# Altium footprint library PCB_GENERAL.PcbLib: 226 footprints (part 9 of 15)
Each footprint in its own frame and in the unit in brackets; x right, y up, seen from the top. Pads: shape width x height; smd on the part's side, far side on the other; paste and mask are expansions set on the pad; w line width, h text height; cw(c..) or ccw(c..) is an arc to the next point about the centre after c.
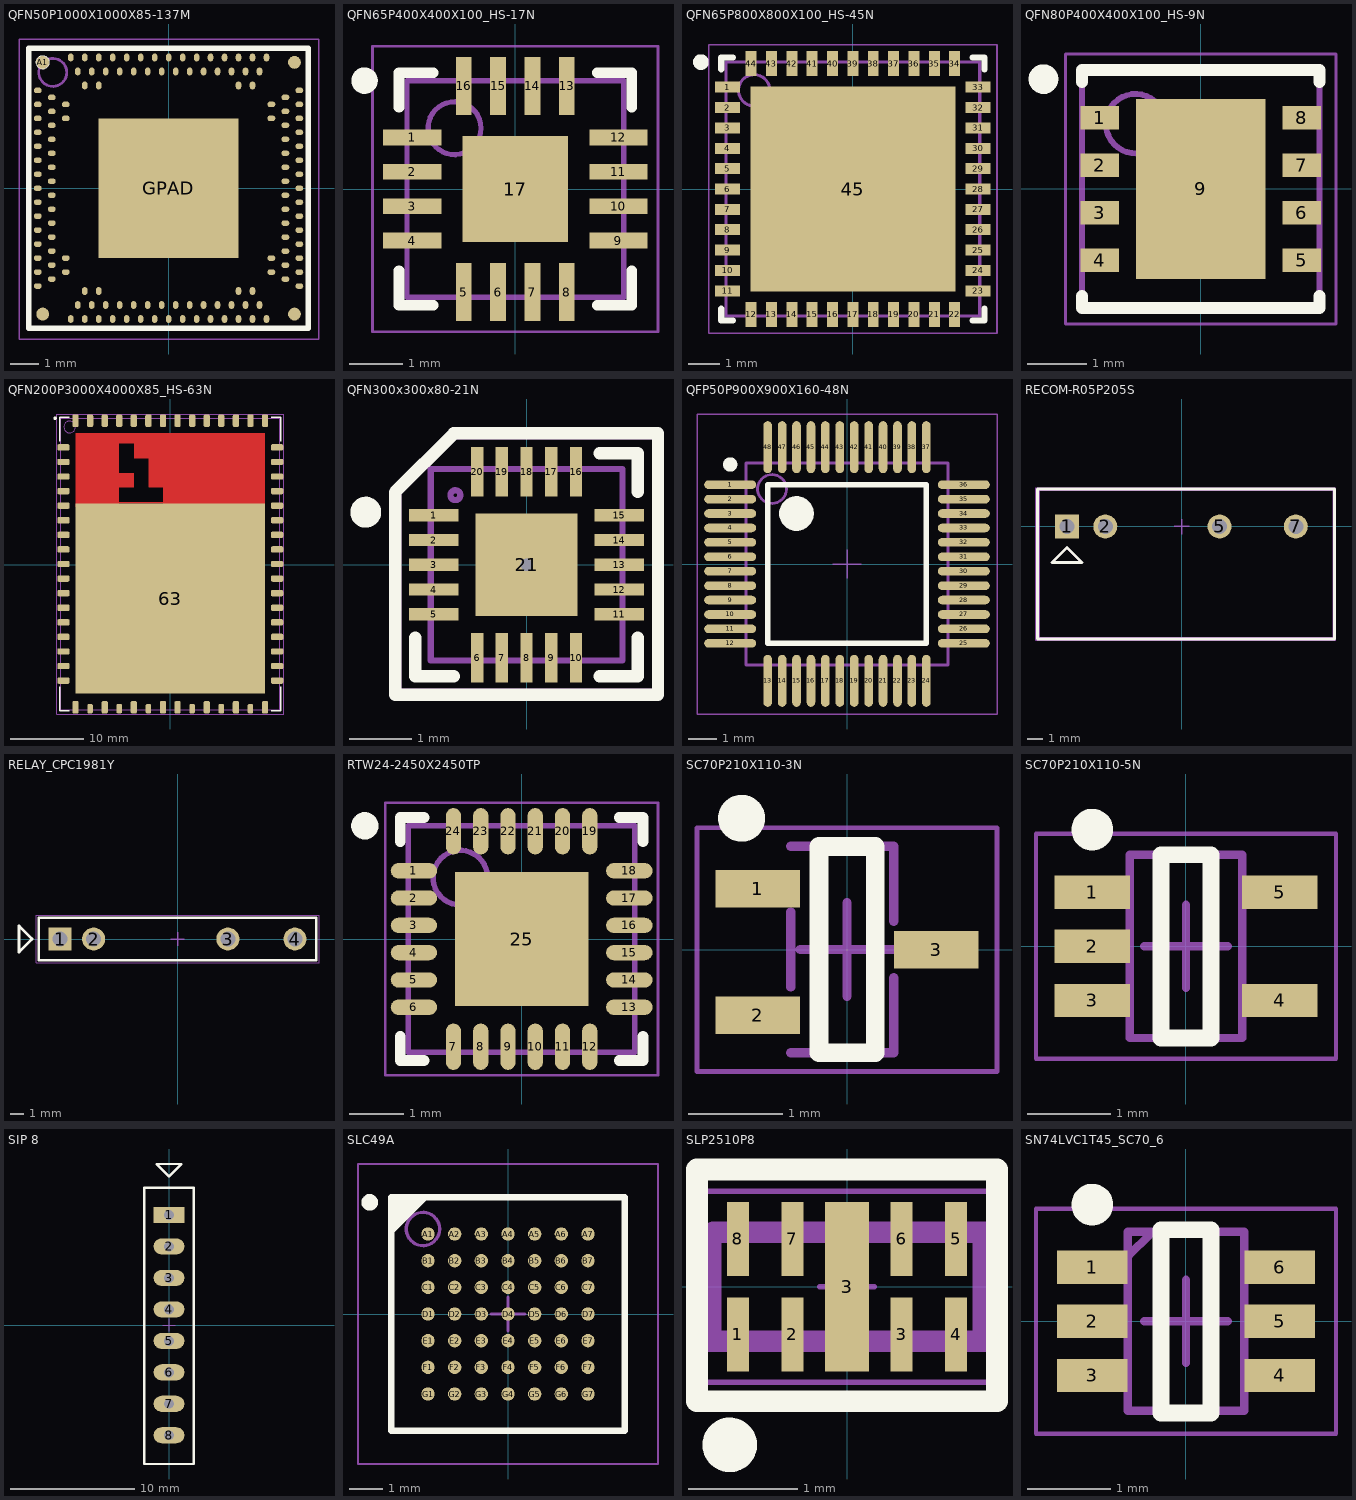
[diagram p8: the footprints below, top view; thin cyan lines are the x and y axes]

## QFN50P1000X1000X85-137M [mm] "Double Row QFN, 137-Leads, Body 10.0x10.0mm (max), Pitch 0.50mm, IPC Low Density"
height 0.85
pads (137):
  round 0.46 smd: A1(-4.5,4.5) A17(-4.5,-4.5) A33(4.5,-4.5) A49(4.5,4.5)
  oval 0.28x0.2 smd: A2(-4.675,3.5) A3(-4.675,3) A4(-4.675,2.5) A5(-4.675,2) A6(-4.675,1.5) A7(-4.675,1) A8(-4.675,0.5) A9(-4.675,0) A10(-4.675,-0.5) A11(-4.675,-1) A12(-4.675,-1.5) A13(-4.675,-2) A14(-4.675,-2.5) A15(-4.675,-3) A16(-4.675,-3.5) A34(4.675,-3.5) A35(4.675,-3) A36(4.675,-2.5) A37(4.675,-2) A38(4.675,-1.5) A39(4.675,-1) A40(4.675,-0.5) A41(4.675,0) A42(4.675,0.5) A43(4.675,1) A44(4.675,1.5) A45(4.675,2) A46(4.675,2.5) A47(4.675,3) A48(4.675,3.5) B1(-4.175,3.25) B2(-4.175,2.75) B3(-4.175,2.25) B4(-4.175,1.75) B5(-4.175,1.25) B6(-4.175,0.75) B7(-4.175,0.25) B8(-4.175,-0.25) B9(-4.175,-0.75) B10(-4.175,-1.25) B11(-4.175,-1.75) B12(-4.175,-2.25) B13(-4.175,-2.75) B14(-4.175,-3.25) B29(4.175,-3.25) B30(4.175,-2.75) B31(4.175,-2.25) B32(4.175,-1.75) B33(4.175,-1.25) B34(4.175,-0.75) B35(4.175,-0.25) B36(4.175,0.25) B37(4.175,0.75) B38(4.175,1.25) B39(4.175,1.75) B40(4.175,2.25) B41(4.175,2.75) B42(4.175,3.25) C1(-3.675,3) C2(-3.675,2.5) C3(-3.675,-2.5) C4(-3.675,-3) C9(3.675,-3) C10(3.675,-2.5) C11(3.675,2.5) C12(3.675,3)
  oval 0.2x0.28 smd: A18(-3.5,-4.675) A19(-3,-4.675) A20(-2.5,-4.675) A21(-2,-4.675) A22(-1.5,-4.675) A23(-1,-4.675) A24(-0.5,-4.675) A25(0,-4.675) A26(0.5,-4.675) A27(1,-4.675) A28(1.5,-4.675) A29(2,-4.675) A30(2.5,-4.675) A31(3,-4.675) A32(3.5,-4.675) A50(3.5,4.675) A51(3,4.675) A52(2.5,4.675) A53(2,4.675) A54(1.5,4.675) A55(1,4.675) A56(0.5,4.675) A57(0,4.675) A58(-0.5,4.675) A59(-1,4.675) A60(-1.5,4.675) A61(-2,4.675) A62(-2.5,4.675) A63(-3,4.675) A64(-3.5,4.675) B15(-3.25,-4.175) B16(-2.75,-4.175) B17(-2.25,-4.175) B18(-1.75,-4.175) B19(-1.25,-4.175) B20(-0.75,-4.175) B21(-0.25,-4.175) B22(0.25,-4.175) B23(0.75,-4.175) B24(1.25,-4.175) B25(1.75,-4.175) B26(2.25,-4.175) B27(2.75,-4.175) B28(3.25,-4.175) B43(3.25,4.175) B44(2.75,4.175) B45(2.25,4.175) B46(1.75,4.175) B47(1.25,4.175) B48(0.75,4.175) B49(0.25,4.175) B50(-0.25,4.175) B51(-0.75,4.175) B52(-1.25,4.175) B53(-1.75,4.175) B54(-2.25,4.175) B55(-2.75,4.175) B56(-3.25,4.175) C5(-3,-3.675) C6(-2.5,-3.675) C7(2.5,-3.675) C8(3,-3.675) C13(3,3.675) C14(2.5,3.675) C15(-2.5,3.675) C16(-3,3.675)
  rect 5x5 smd paste-5: GPAD(0,0)
Top Overlay:
  circle w0.25: c-4.5,4.5 r0.125
  lines w0.2: -5,-5 -5,5 5,5 5,-5 -5,-5
Top Paste:
  region: 1.425,1.425 0.16,1.425 0.16,0.16 1.425,0.16
  region: 1.425,-1.425 1.425,-0.16 0.16,-0.16 0.16,-1.425
  region: -1.425,-1.425 -0.16,-1.425 -0.16,-0.16 -1.425,-0.16
  region: -1.425,1.425 -1.425,0.16 -0.16,0.16 -0.16,1.425
Mechanical 11:
  text ".Designator" at -2.6,1.05 h1
Mechanical 14:
  circle w0.1: c-4.14,4.14 r0.5
  lines w0.1: -5,-5 -5,5 5,5 5,-5 -5,-5
Mechanical 15:
  lines w0.05: -5.335,-5.39 5.365,-5.39 5.365,5.335 -5.335,5.335 -5.335,-5.39
  lines w0.1: -0.5,0 0.5,0 ; 0,-0.5 0,0.5
3D body: height 0.85, standoff 0.12, extent -5,-5 5,5

## QFN65P400X400X100_HS-17N [mm] "QFN, 16-Leads, Body 4,00x4,00mm, Pitch 0,65mm, Thermal Pad 2,10x2,10mm, IPC Medium Density"
height 1
pads (17):
  rect 1.1x0.3 smd: 1(-1.95,0.975) 2(-1.95,0.325) 3(-1.95,-0.325) 4(-1.95,-0.975) 9(1.95,-0.975) 10(1.95,-0.325) 11(1.95,0.325) 12(1.95,0.975)
  rect 0.3x1.1 smd: 5(-0.975,-1.95) 6(-0.325,-1.95) 7(0.325,-1.95) 8(0.975,-1.95) 13(0.975,1.95) 14(0.325,1.95) 15(-0.325,1.95) 16(-0.975,1.95)
  rect 2x2 smd: 17(0,0)
Top Overlay:
  circle w0.25: c-2.85,2.05 r0.125
  lines w0.2: -2.2,-1.55 -2.2,-2.2 -1.55,-2.2 ; -2.2,1.55 -2.2,2.2 -1.55,2.2 ; 1.55,-2.2 2.2,-2.2 2.2,-1.55 ; 1.55,2.2 2.2,2.2 2.2,1.55
Mechanical 11:
  text ".Designator" at -1.9,-0.3 h1
Mechanical 14:
  circle w0.1: c-1.15,1.15 r0.5
  lines w0.1: -2.05,-2.05 -2.05,2.05 2.05,2.05 2.05,-2.05 -2.05,-2.05
Mechanical 15:
  lines w0.05: -2.7,-2.7 -2.7,2.7 2.7,2.7 2.7,-2.7 -2.7,-2.7
  lines w0.1: -0.5,0 0.5,0 ; 0,-0.5 0,0.5
3D body "QFN65P400X400X100_HS-17N.step": height 1, standoff 0, extent -2.051,-2.051 2.051,2.051

## QFN65P800X800X100_HS-45N [mm] "QFN, 44-Leads, Body 8,00x8,00mm, Pitch 0,65mm, Thermal Pad 6,55x6,55mm, IPC Medium Density"
height 1
pads (45):
  rect 0.8x0.35 smd: 1(-4,3.25) 2(-4,2.6) 3(-4,1.95) 4(-4,1.3) 5(-4,0.65) 6(-4,0) 7(-4,-0.65) 8(-4,-1.3) 9(-4,-1.95) 10(-4,-2.6) 11(-4,-3.25) 23(4,-3.25) 24(4,-2.6) 25(4,-1.95) 26(4,-1.3) 27(4,-0.65) 28(4,0) 29(4,0.65) 30(4,1.3) 31(4,1.95) 32(4,2.6) 33(4,3.25)
  rect 0.35x0.8 smd: 12(-3.25,-4) 13(-2.6,-4) 14(-1.95,-4) 15(-1.3,-4) 16(-0.65,-4) 17(0,-4) 18(0.65,-4) 19(1.3,-4) 20(1.95,-4) 21(2.6,-4) 22(3.25,-4) 34(3.25,4) 35(2.6,4) 36(1.95,4) 37(1.3,4) 38(0.65,4) 39(0,4) 40(-0.65,4) 41(-1.3,4) 42(-1.95,4) 43(-2.6,4) 44(-3.25,4)
  rect 6.55x6.55 smd: 45(0,0)
Top Overlay:
  circle w0.25: c-4.85,4.05 r0.125
  lines w0.2: -4.2,-3.825 -4.2,-4.2 -3.825,-4.2 ; -4.2,3.825 -4.2,4.2 -3.825,4.2 ; 3.825,-4.2 4.2,-4.2 4.2,-3.825 ; 3.825,4.2 4.2,4.2 4.2,3.825
Mechanical 11:
  text ".Designator" at -2.2,-0.3 h1
Mechanical 14:
  circle w0.1: c-3.15,3.15 r0.5
  lines w0.1: -4.05,-4.05 4.05,-4.05 4.05,4.05 -4.05,4.05 -4.05,-4.05
Mechanical 15:
  lines w0.05: -4.6,-4.6 4.6,-4.6 4.6,4.6 -4.6,4.6 -4.6,-4.6
  lines w0.1: -0.5,0 0.5,0 ; 0,-0.5 0,0.5
3D body: height 1, standoff 0.05, extent -4.05,-4.05 4.05,4.05

## QFN80P400X400X100_HS-9N [mm] "PQFN, 8-Leads, Body 4,00x4,00mm, Pitch 0,80mm, Thermal Pad 2,18x3,03mm, IPC Medium Density"
height 1
pads (17):
  rect 0.65x0.4 smd: 1(-1.7,1.2) 2(-1.7,0.4) 3(-1.7,-0.4) 4(-1.7,-1.2) 5(1.7,-1.2) 6(1.7,-0.4) 7(1.7,0.4) 8(1.7,1.2)
  rect 0x0 smd: 9(-0.85,0) 10(-0.35,0) 11(0,0.85) 12(0,0.35) 13(0.85,0) 14(0.35,0) 15(0,-0.85) 16(0,-0.35)
  rect 2.18x3.03 smd: 9(0,0)
Top Overlay:
  circle w0.25: c-2.65,1.85 r0.125
  lines w0.2: -2,-1.8 -2,-2 2,-2 2,-1.8 ; -2,1.8 -2,2 2,2 2,1.8
Mechanical 11:
  text ".Designator" at -2.325,2.675 h1
Mechanical 14:
  circle w0.1: c-1.1,1.1 r0.5
  lines w0.1: -2,-2 -2,2 2,2 2,-2 -2,-2
Mechanical 15:
  lines w0.05: -0.5,0 0.5,0 ; 0,-0.5 0,0.5 ; -2.275,-2.275 -2.275,2.275 2.275,2.275 2.275,-2.275 -2.275,-2.275
3D body: height 1, standoff 0.05, extent -2,-2 2,2

## QFN200P3000X4000X85_HS-63N [mm] "QFN, 62-Leads, Body 30,00x40,00mm, Pitch 2,00mm, Thermal Pad 28,30x38,30mm, IPC Medium Density"
height 0.85
pads (63):
  rrect50% 1.7x0.87 smd: 1(-14.65,16.1) 2(-14.65,14.1) 3(-14.65,12.1) 4(-14.65,10.1) 5(-14.65,8.1) 6(-14.65,6.1) 7(-14.65,4.1) 8(-14.65,2.1) 9(-14.65,0.1) 10(-14.65,-1.9) 11(-14.65,-3.9) 12(-14.65,-5.9) 13(-14.65,-7.9) 14(-14.65,-9.9) 15(-14.65,-11.9) 16(-14.65,-13.9) 17(-14.65,-15.9) 32(14.65,-15.9) 33(14.65,-13.9) 34(14.65,-11.9) 35(14.65,-9.9) 36(14.65,-7.9) 37(14.65,-5.9) 38(14.65,-3.9) 39(14.65,-1.9) 40(14.65,0.1) 41(14.65,2.1) 42(14.65,4.1) 43(14.65,6.1) 44(14.65,8.1) 45(14.65,10.1) 46(14.65,12.1) 47(14.65,14.1) 48(14.65,16.1)
  rrect50% 0.87x1.7 smd: 18(-13,-19.55) 20(-9,-19.55) 22(-5,-19.55) 24(-1,-19.55) 25(1,-19.55) 27(5,-19.55) 29(9,-19.55) 31(13,-19.55) 49(13,19.75) 50(11,19.75) 51(9,19.75) 52(7,19.75) 53(5,19.75) 54(3,19.75) 55(1,19.75) 56(-1,19.75) 57(-3,19.75) 58(-5,19.75) 59(-7,19.75) 60(-9,19.75) 61(-11,19.75) 62(-13,19.75)
  rrect50% 0.76x1.28 smd: 19(-11,-19.75) 21(-7,-19.75) 23(-3,-19.75) 26(3,-19.75) 28(7,-19.75) 30(11,-19.75)
  rect 26x26.1 smd paste-100: 63(0,-4.645)
Top Layer:
  rectangle: -7,8.4 -1,8.6
  rectangle: -7.1,16.6 -1,18.1
  rectangle: -8,10.6 -5,12.6
  rectangle: -13,8 -7,18.1
  rectangle: -1,7.8 13,18.1
  rectangle: -5,14.6 -2.8,16.8
  rectangle: -3,10.6 -0.6,16.8
Top Overlay:
  circle w0.25: c-15.8,20.1 r0.125
  lines w0.2: -15.15,-16.75 -15.15,-20.05 -13.85,-20.05 ; -15.15,16.95 -15.15,20.25 -13.85,20.25 ; 13.85,-20.05 15.15,-20.05 15.15,-16.75 ; 13.85,20.25 15.15,20.25 15.15,16.95
Top Paste:
  rectangle: -2.5,11.1 -1.5,11.8
  rectangle: -6.5,17.1 -4.5,17.6
  rectangle: -3.5,15.8 -1.5,17.8
  rectangle: -2.5,12.8 -1.5,14.8
  rectangle: -6.5,11.1 -5.5,12.1
  region: 12.5,17.6 10.5,17.6 10.5,15.8 12.5,15.8
  region: 9.5,17.6 7.5,17.6 7.5,15.8 9.5,15.8
  region: 6.5,17.6 4.5,17.6 4.5,15.8 6.5,15.8
  region: 3.5,17.6 1.5,17.6 1.5,15.8 3.5,15.8
  rectangle: -0.5,15.8 0.5,17.6
  region: 12.5,14.8 10.5,14.8 10.5,12.8 12.5,12.8
  region: 9.5,14.8 7.5,14.8 7.5,12.8 9.5,12.8
  region: 6.5,14.8 4.5,14.8 4.5,12.8 6.5,12.8
  region: 3.5,14.8 1.5,14.8 1.5,12.8 3.5,12.8
  rectangle: -0.5,12.8 0.5,14.8
  region: 12.5,11.8 10.5,11.8 10.5,9.8 12.5,9.8
  region: 9.5,11.8 7.5,11.8 7.5,9.8 9.5,9.8
  region: 6.5,11.8 4.5,11.8 4.5,9.8 6.5,9.8
  region: 3.5,11.8 1.5,11.8 1.5,9.8 3.5,9.8
  rectangle: -0.5,9.8 0.5,11.8
  rectangle: -12.5,15.8 -10.5,17.6
  rectangle: -9.5,15.8 -7.5,17.6
  rectangle: -12.5,12.8 -10.5,14.8
  rectangle: -9.5,12.8 -7.5,14.8
  rectangle: -12.5,9.8 -10.5,11.8
  rectangle: -9.5,9.8 -7.5,11.8
  rectangle: -0.5,6.8 0.5,8.8
  region: 3.5,8.8 1.5,8.8 1.5,6.8 3.5,6.8
  region: 6.5,8.8 4.5,8.8 4.5,6.8 6.5,6.8
  region: 9.5,8.8 7.5,8.8 7.5,6.8 9.5,6.8
  region: 12.5,8.8 10.5,8.8 10.5,6.8 12.5,6.8
  rectangle: -3.5,6.8 -1.5,8.1
  rectangle: -6.5,6.8 -4.5,8.1
  rectangle: -9.5,6.8 -7.5,8.8
  rectangle: -12.5,6.8 -10.5,8.8
  rectangle: -0.5,3.8 0.5,5.8
  region: 3.5,5.8 1.5,5.8 1.5,3.8 3.5,3.8
  region: 6.5,5.8 4.5,5.8 4.5,3.8 6.5,3.8
  region: 9.5,5.8 7.5,5.8 7.5,3.8 9.5,3.8
  region: 12.5,5.8 10.5,5.8 10.5,3.8 12.5,3.8
  rectangle: -3.5,3.8 -1.5,5.8
  rectangle: -6.5,3.8 -4.5,5.8
  rectangle: -9.5,3.8 -7.5,5.8
  rectangle: -12.5,3.8 -10.5,5.8
  rectangle: -0.5,0.8 0.5,2.8
  region: 3.5,2.8 1.5,2.8 1.5,0.8 3.5,0.8
  region: 6.5,2.8 4.5,2.8 4.5,0.8 6.5,0.8
  region: 9.5,2.8 7.5,2.8 7.5,0.8 9.5,0.8
  region: 12.5,2.8 10.5,2.8 10.5,0.8 12.5,0.8
  rectangle: -3.5,0.8 -1.5,2.8
  rectangle: -6.5,0.8 -4.5,2.8
  rectangle: -9.5,0.8 -7.5,2.8
  rectangle: -12.5,0.8 -10.5,2.8
  rectangle: -0.5,-2.2 0.5,-0.2
  region: 3.5,-0.2 1.5,-0.2 1.5,-2.2 3.5,-2.2
  region: 6.5,-0.2 4.5,-0.2 4.5,-2.2 6.5,-2.2
  region: 9.5,-0.2 7.5,-0.2 7.5,-2.2 9.5,-2.2
  region: 12.5,-0.2 10.5,-0.2 10.5,-2.2 12.5,-2.2
  rectangle: -3.5,-2.2 -1.5,-0.2
  rectangle: -6.5,-2.2 -4.5,-0.2
  rectangle: -9.5,-2.2 -7.5,-0.2
  rectangle: -12.5,-2.2 -10.5,-0.2
  rectangle: -0.5,-5.2 0.5,-3.2
  region: 3.5,-3.2 1.5,-3.2 1.5,-5.2 3.5,-5.2
  region: 6.5,-3.2 4.5,-3.2 4.5,-5.2 6.5,-5.2
  region: 9.5,-3.2 7.5,-3.2 7.5,-5.2 9.5,-5.2
  region: 12.5,-3.2 10.5,-3.2 10.5,-5.2 12.5,-5.2
  rectangle: -3.5,-5.2 -1.5,-3.2
  rectangle: -6.5,-5.2 -4.5,-3.2
  rectangle: -9.5,-5.2 -7.5,-3.2
  rectangle: -12.5,-5.2 -10.5,-3.2
  rectangle: -0.5,-8.2 0.5,-6.2
  region: 3.5,-6.2 1.5,-6.2 1.5,-8.2 3.5,-8.2
  region: 6.5,-6.2 4.5,-6.2 4.5,-8.2 6.5,-8.2
  region: 9.5,-6.2 7.5,-6.2 7.5,-8.2 9.5,-8.2
  region: 12.5,-6.2 10.5,-6.2 10.5,-8.2 12.5,-8.2
  rectangle: -3.5,-8.2 -1.5,-6.2
  rectangle: -6.5,-8.2 -4.5,-6.2
  rectangle: -9.5,-8.2 -7.5,-6.2
  rectangle: -12.5,-8.2 -10.5,-6.2
  rectangle: -0.5,-11.2 0.5,-9.2
  region: 3.5,-9.2 1.5,-9.2 1.5,-11.2 3.5,-11.2
  region: 6.5,-9.2 4.5,-9.2 4.5,-11.2 6.5,-11.2
  region: 9.5,-9.2 7.5,-9.2 7.5,-11.2 9.5,-11.2
  region: 12.5,-9.2 10.5,-9.2 10.5,-11.2 12.5,-11.2
  rectangle: -3.5,-11.2 -1.5,-9.2
  rectangle: -6.5,-11.2 -4.5,-9.2
  rectangle: -9.5,-11.2 -7.5,-9.2
  rectangle: -12.5,-11.2 -10.5,-9.2
  rectangle: -12.5,-14.2 -10.5,-12.2
  rectangle: -9.5,-14.2 -7.5,-12.2
  rectangle: -6.5,-14.2 -4.5,-12.2
  rectangle: -3.5,-14.2 -1.5,-12.2
  region: 12.5,-12.2 10.5,-12.2 10.5,-14.2 12.5,-14.2
  region: 9.5,-12.2 7.5,-12.2 7.5,-14.2 9.5,-14.2
  region: 6.5,-12.2 4.5,-12.2 4.5,-14.2 6.5,-14.2
  region: 3.5,-12.2 1.5,-12.2 1.5,-14.2 3.5,-14.2
  rectangle: -0.5,-14.2 0.5,-12.2
  rectangle: -0.5,-17.2 0.5,-15.2
  region: 3.5,-15.2 1.5,-15.2 1.5,-17.2 3.5,-17.2
  region: 6.5,-15.2 4.5,-15.2 4.5,-17.2 6.5,-17.2
  region: 9.5,-15.2 7.5,-15.2 7.5,-17.2 9.5,-17.2
  region: 12.5,-15.2 10.5,-15.2 10.5,-17.2 12.5,-17.2
  rectangle: -3.5,-17.2 -1.5,-15.2
  rectangle: -6.5,-17.2 -4.5,-15.2
  rectangle: -9.5,-17.2 -7.5,-15.2
  rectangle: -12.5,-17.2 -10.5,-15.2
Top Solder:
  rectangle: -13.1,8.4 -6.9,18.2
  rectangle: -7.2,10.5 -4.9,12.7
  rectangle: -3.1,10.5 -0.6,18.2
  rectangle: -5.1,14.5 -2.9,18.2
  rectangle: -7.1,16.5 -4.8,18.2
  rectangle: -7,8.3 13.1,8.7
  rectangle: -1.1,8.4 13.1,18.2
Mechanical 11:
  text ".Designator" at -2.775,-0.79 h1
Mechanical 14:
  circle w0.1: c-13.8,18.9 r0.8
  lines w0.1: -15,-19.9 15,-19.9 15,20.1 -15,20.1 -15,-19.9
Mechanical 15:
  lines w0.05: -15.575,-20.475 15.575,-20.475 15.575,20.675 -15.575,20.675 -15.575,-20.475
  lines w0.1: -0.5,0.1 0.5,0.1 ; 0,-0.4 0,0.6
3D body: height 3.5, standoff 0, extent -15,-19.9 15,20.1

## QFN300x300x80-21N [mm] "QFN, 20-Leads, Body 3x3mm, Pitch 0.4mm, Thermal Pad 1.65x1.65mm, IPC Medium Density"
height 0.8
pads (21):
  rect 0.8x0.2 smd: 1(-1.5,0.8) 2(-1.5,0.4) 3(-1.5,0) 4(-1.5,-0.4) 5(-1.5,-0.8) 11(1.5,-0.8) 12(1.5,-0.4) 13(1.5,0) 14(1.5,0.4) 15(1.5,0.8)
  rect 0.2x0.8 smd: 6(-0.8,-1.5) 7(-0.4,-1.5) 8(0,-1.5) 9(0.4,-1.5) 10(0.8,-1.5) 16(0.8,1.5) 17(0.4,1.5) 18(0,1.5) 19(-0.4,1.5) 20(-0.8,1.5)
  rect 1.65x1.65 smd: 21(0,0)
via 0,0 diameter 0.5 hole 0.2
Top Overlay:
  circle w0.25: c-2.6,0.85 r0.125
  lines w0.2: -1.8,-1.18 -1.8,-1.8 -1.18,-1.8 ; 1.18,-1.8 1.8,-1.8 1.8,-1.18 ; 1.18,1.8 1.8,1.8 1.8,1.18 ; -2.125,-2.1 -2.125,1.175 -1.175,2.125 2.125,2.125 2.125,-2.1 -2.125,-2.1
Mechanical 11:
  text ".Designator" at -2.025,2.35 h1
Mechanical 14:
  circle w0.1: c-1.15,1.125 r0.08
  lines w0.1: -1.55,-1.55 -1.55,1.55 1.55,1.55 1.55,-1.55 -1.55,-1.55
Mechanical 15:
  lines w0.05: -0.5,0 0.5,0 ; 0,-0.5 0,0.5 ; -2.05,-2.025 -2.05,1.15 -1.15,2.05 2.05,2.05 2.05,-2.025 -2.05,-2.025
3D body "User Library-QFN-20-2.STEP": height 0.75, standoff 0, extent -1.51,-1.51 1.51,1.51

## QFP50P900X900X160-48N [mm] "Thin QFP, 48-Leads, Body 7x7mm, Pitch 0.5mm, IPC Medium Density"
height 1.6
pads (48):
  oval 1.8x0.3 smd: 1(-4.05,2.75) 2(-4.05,2.25) 3(-4.05,1.75) 4(-4.05,1.25) 5(-4.05,0.75) 6(-4.05,0.25) 7(-4.05,-0.25) 8(-4.05,-0.75) 9(-4.05,-1.25) 10(-4.05,-1.75) 11(-4.05,-2.25) 12(-4.05,-2.75) 25(4.05,-2.75) 26(4.05,-2.25) 27(4.05,-1.75) 28(4.05,-1.25) 29(4.05,-0.75) 30(4.05,-0.25) 31(4.05,0.25) 32(4.05,0.75) 33(4.05,1.25) 34(4.05,1.75) 35(4.05,2.25) 36(4.05,2.75)
  oval 0.3x1.8 smd: 13(-2.75,-4.05) 14(-2.25,-4.05) 15(-1.75,-4.05) 16(-1.25,-4.05) 17(-0.75,-4.05) 18(-0.25,-4.05) 19(0.25,-4.05) 20(0.75,-4.05) 21(1.25,-4.05) 22(1.75,-4.05) 23(2.25,-4.05) 24(2.75,-4.05) 37(2.75,4.05) 38(2.25,4.05) 39(1.75,4.05) 40(1.25,4.05) 41(0.75,4.05) 42(0.25,4.05) 43(-0.25,4.05) 44(-0.75,4.05) 45(-1.25,4.05) 46(-1.75,4.05) 47(-2.25,4.05) 48(-2.75,4.05)
Top Overlay:
  circle w0.25: c-4.05,3.45 r0.125
  circle w0.6: c-1.75,1.75 r0.3
  lines w0.2: -2.75,-2.75 -2.75,2.75 2.75,2.75 2.75,-2.75 -2.75,-2.75
Mechanical 11:
  text ".Designator" at -4.856,5.569 h1
Mechanical 14:
  circle w0.1: c-2.6,2.6 r0.5
  lines w0.1: -3.5,-3.5 -3.5,3.5 3.5,3.5 3.5,-3.5 -3.5,-3.5
Mechanical 15:
  lines w0.05: -0.5,0 0.5,0 ; 0,-0.5 0,0.5 ; -5.2,-5.2 -5.2,5.2 5.2,5.2 5.2,-5.2 -5.2,-5.2
3D body: height 1.6, standoff 0, extent -3.5,-3.5 3.5,3.5

## RECOM-R05P205S [mm]
height 12.5
pads (4):
  rect 1.6x1.6 hole 1: 1(-7.62,0)
  round 1.6 hole 1: 2(-5.08,0) 5(2.54,0) 7(7.62,0)
Top Overlay:
  lines w0.2: -9.6,-7.5 10.2,-7.5 10.2,2.5 -9.6,2.5 -9.6,-7.5 ; -8.64,-2.4 -7.64,-1.4 -6.64,-2.4 -8.64,-2.4
Mechanical 11:
  text ".Designator" at -2.4,-0.6 h1
Mechanical 14:
  lines w0.1: -7.64,-1.4 -6.64,-2.4 -8.64,-2.4 -7.64,-1.4 ; -7.64,-1.4 -7.64,-1.4 ; -9.5,-7.4 10.1,-7.4 10.1,2.4 -9.5,2.4 -9.5,-7.4 ; -8.02,-0.4 -7.222,-0.4 -7.222,0.399 -8.02,0.399 -8.02,-0.4 ; -5.48,-0.4 -4.682,-0.4 -4.682,0.399 -5.48,0.399 -5.48,-0.4 ; 2.14,-0.4 2.938,-0.4 2.938,0.399 2.14,0.399 2.14,-0.4 ; 7.22,-0.4 8.018,-0.4 8.018,0.399 7.22,0.399 7.22,-0.4
Mechanical 15:
  lines w0.05: -9.7,-7.6 10.3,-7.6 10.3,2.6 -9.7,2.6 -9.7,-7.6
  lines w0.1: -0.5,0 0.5,0 ; 0,-0.5 0,0.5
3D body: height 2.2, standoff -1.8, extent 7.222,-0.399 8.02,0.4
3D body: height 2.2, standoff -1.8, extent 2.142,-0.399 2.94,0.4
3D body: height 2.2, standoff -1.8, extent -5.478,-0.399 -4.68,0.4
3D body: height 2.2, standoff -1.8, extent -8.018,-0.399 -7.22,0.4
3D body: height 12.5, standoff 0, extent -9.54,-7.4 10.06,2.4

## RELAY_CPC1981Y [mm]
height 11.3
pads (4):
  rect 1.75x1.75 hole 1.15: 1(-8.89,0)
  round 1.75 hole 1.15: 2(-6.35,0) 3(3.81,0) 4(8.89,0)
Top Overlay:
  lines w0.2: -11,0 -12,1 -12,-1 -11,0 ; -11,0 -11,0 ; -10.5,-1.6 -10.5,1.6 10.5,1.6 10.5,-1.6 -10.5,-1.6
Mechanical 11:
  text ".Designator" at -5.8,-0.5 h1.52
Mechanical 14:
  lines w0.1: -11,0 -12,-1 -12,1 -11,0 ; -11,0 -11,0 ; -10.5,-1.6 -10.5,1.6 10.5,1.6 10.5,-1.6 -10.5,-1.6
Mechanical 15:
  lines w0.05: -10.69,-1.8 -10.69,1.8 10.71,1.8 10.71,-1.8 -10.69,-1.8
  lines w0.1: -0.5,0 0.5,0 ; 0,-0.5 0,0.5
3D body: height 11.2, standoff 1, extent -10.49,-1.6 10.51,1.6
3D body: height 2.2, standoff -1.8, extent -9.288,-0.399 -8.49,0.4
3D body: height 2.2, standoff -1.8, extent -6.748,-0.399 -5.95,0.4
3D body: height 2.2, standoff -1.8, extent 3.412,-0.399 4.21,0.4
3D body: height 2.2, standoff -1.8, extent 8.492,-0.399 9.29,0.4

## RTW24-2450X2450TP [mm] "QFN, 24-Leads, Body 4x4mm, Pitch 0.5mm, Thermal Pad 2.45x2.45mm, TI Recommended"
height 0.8
pads (25):
  oval 0.85x0.28 smd mask+0.07: 1(-1.975,1.25) 2(-1.975,0.75) 3(-1.975,0.25) 4(-1.975,-0.25) 5(-1.975,-0.75) 6(-1.975,-1.25) 13(1.975,-1.25) 14(1.975,-0.75) 15(1.975,-0.25) 16(1.975,0.25) 17(1.975,0.75) 18(1.975,1.25)
  oval 0.28x0.85 smd mask+0.07: 7(-1.25,-1.975) 8(-0.75,-1.975) 9(-0.25,-1.975) 10(0.25,-1.975) 11(0.75,-1.975) 12(1.25,-1.975) 19(1.25,1.975) 20(0.75,1.975) 21(0.25,1.975) 22(-0.25,1.975) 23(-0.75,1.975) 24(-1.25,1.975)
  rect 2.45x2.45 smd paste-1.225: 25(0,0)
Top Overlay:
  circle w0.25: c-2.875,2.075 r0.125
  lines w0.2: -2.225,-1.79 -2.225,-2.225 -1.79,-2.225 ; -2.225,1.79 -2.225,2.225 -1.79,2.225 ; 1.79,-2.225 2.225,-2.225 2.225,-1.79 ; 1.79,2.225 2.225,2.225 2.225,1.79
Top Paste:
  region: 1.15,1.15 0.15,1.15 0.15,0.15 1.15,0.15
  region: 1.15,-0.15 0.15,-0.15 0.15,-1.15 1.15,-1.15
  rectangle: -1.15,-1.15 -0.15,-0.15
  rectangle: -1.15,0.15 -0.15,1.15
Mechanical 11:
  text ".Designator" at -1.06,-0.325 h1
Mechanical 14:
  circle w0.1: c-1.125,1.125 r0.5
  lines w0.1: -2.075,-2.075 2.075,-2.075 2.075,2.075 -2.075,2.075 -2.075,-2.075
Mechanical 15:
  lines w0.05: -2.5,-2.5 2.5,-2.5 2.5,2.5 -2.5,2.5 -2.5,-2.5
  lines w0.1: -0.5,0 0.5,0 ; 0,-0.5 0,0.5
3D body: height 0.8, standoff 0, extent -2.074,-2.074 2.074,2.074

## SC70P210X110-3N [mm] "SC70, 5-Leads, Body 2,00x2,10mm, Pitch 0,65mm, IPC Medium Density"
height 1.1
pads (3):
  rect 0.9x0.4 smd: 1(-0.95,0.65) 2(-0.95,-0.7) 3(0.95,0)
Top Overlay:
  circle w0.25: c-1.125,1.4 r0.125
  lines w0.2: -0.3,-1.1 0.3,-1.1 0.3,1.1 -0.3,1.1 -0.3,-1.1
Mechanical 13:
  lines w0.1: -0.6,-1.1 0.5,-1.1 0.5,-0.3 ; -0.6,-0.4 -0.6,0.4 ; -0.6,1.1 0.5,1.1 0.5,0.3
Mechanical 15:
  lines w0.05: -1.6,-1.3 -1.6,1.3 1.6,1.3 1.6,-1.3 -1.6,-1.3
  lines w0.1: -0.5,0 0.5,0 ; 0,-0.5 0,0.5
3D body "sc70-3.STEP": height 1, standoff 0, extent -1.15,-1.05 1.15,1.05

## SC70P210X110-5N [mm] "SC70, 5-Leads, Body 2,00x2,10mm, Pitch 0,65mm, IPC Medium Density"
height 1.1
pads (5):
  rect 0.9x0.4 smd: 1(-1.125,0.65) 2(-1.125,0) 3(-1.125,-0.65) 4(1.125,-0.65) 5(1.125,0.65)
Top Overlay:
  circle w0.25: c-1.125,1.4 r0.125
  lines w0.2: -0.3,-1.1 -0.3,1.1 0.3,1.1 0.3,-1.1 -0.3,-1.1
Mechanical 13:
  lines w0.1: -0.675,-1.1 0.675,-1.1 0.675,1.1 -0.675,1.1 -0.675,-1.1
Mechanical 15:
  lines w0.05: -1.8,-1.35 1.8,-1.35 1.8,1.35 -1.8,1.35 -1.8,-1.35
  lines w0.1: -0.5,0 0.5,0 ; 0,-0.5 0,0.5
3D body: height 1.1, standoff 0.1, extent -0.675,-1.1 0.675,1.1

## SIP 8 [mm]
pads (8):
  rect 2.5x1.3 hole 0.8: 1(0,8.89)
  oval 2.5x1.3 hole 0.8: 2(0,6.35) 3(0,3.81) 4(0,1.27) 5(0,-1.27) 6(0,-3.81) 7(0,-6.35) 8(0,-8.89)
Top Overlay:
  lines w0.2: -2,-11.21 -2,11.09 2,11.09 2,-11.21 -2,-11.21 ; -1,13 0,12 1,13 -1,13
Mechanical 11:
  text ".Designator" at -3.175,-10.16 h1.52
Mechanical 14:
  lines w0.1: -2,-11.21 -2,11.09 2,11.09 2,-11.21 -2,-11.21 ; -1,13 0,12 1,13 -1,13
Mechanical 15:
  lines w0.05: -0.5,0 0.5,0 ; 0,-0.5 0,0.5 ; -2,-11.21 2,-11.21 2,11.09 -2,11.09 -2,-11.21
3D body: height 5, standoff -1.5, extent -0.297,-9.189 0.3,-8.59
3D body: height 5, standoff -1.5, extent -0.297,-6.649 0.3,-6.05
3D body: height 5, standoff -1.5, extent -0.297,-4.109 0.3,-3.51
3D body: height 5, standoff -1.5, extent -0.297,-1.569 0.3,-0.97
3D body: height 5, standoff -1.5, extent -0.297,0.971 0.3,1.57
3D body: height 5, standoff -1.5, extent -0.297,3.511 0.3,4.11
3D body: height 30, standoff 5, extent -2,-11.21 2,11.09
3D body: height 5, standoff -1.5, extent -0.297,8.591 0.3,9.19
3D body: height 5, standoff -1.5, extent -0.297,6.051 0.3,6.65
3D body "precidip_801-83-008-10-012101.stp": height 4.21, standoff -3.17, extent -1.27,-10.16 1.27,10.16

## SLC49A [mm] "BGA, 49-Leads, Body 7x7mm, Pitch 0.8mm"
height 1.5
pads (49):
  round 0.4 smd: A1(-2.4,2.4) A2(-1.6,2.4) A3(-0.8,2.4) A4(0,2.4) A5(0.8,2.4) A6(1.6,2.4) A7(2.4,2.4) B1(-2.4,1.6) B2(-1.6,1.6) B3(-0.8,1.6) B4(0,1.6) B5(0.8,1.6) B6(1.6,1.6) B7(2.4,1.6) C1(-2.4,0.8) C2(-1.6,0.8) C3(-0.8,0.8) C4(0,0.8) C5(0.8,0.8) C6(1.6,0.8) C7(2.4,0.8) D1(-2.4,0) D2(-1.6,0) D3(-0.8,0) D4(0,0) D5(0.8,0) D6(1.6,0) D7(2.4,0) E1(-2.4,-0.8) E2(-1.6,-0.8) E3(-0.8,-0.8) E4(0,-0.8) E5(0.8,-0.8) E6(1.6,-0.8) E7(2.4,-0.8) F1(-2.4,-1.6) F2(-1.6,-1.6) F3(-0.8,-1.6) F4(0,-1.6) F5(0.8,-1.6) F6(1.6,-1.6) F7(2.4,-1.6) G1(-2.4,-2.4) G2(-1.6,-2.4) G3(-0.8,-2.4) G4(0,-2.4) G5(0.8,-2.4) G6(1.6,-2.4) G7(2.4,-2.4)
Top Overlay:
  circle w0.25: c-4.15,3.35 r0.125
  region: -2.5,3.5 -3.5,2.5 -3.5,3.5
  lines w0.2: -3.5,2.5 -2.5,3.5 ; -3.5,-3.5 -3.5,3.5 3.5,3.5 3.5,-3.5 -3.5,-3.5
Mechanical 11:
  text ".Designator" at -1,-0.25 h0.76
Mechanical 14:
  circle w0.1: c-2.55,2.55 r0.5
  lines w0.1: -3.5,-3.5 -3.5,3.5 3.5,3.5 3.5,-3.5 -3.5,-3.5
Mechanical 15:
  lines w0.05: -4.5,-4.5 -4.5,4.5 4.5,4.5 4.5,-4.5 -4.5,-4.5
  lines w0.1: -0.5,0 0.5,0 ; 0,-0.5 0,0.5
3D body: height 1.5, standoff 0, extent -3.5,-3.5 3.5,3.5

## SLP2510P8 [mm]
pads (9):
  rect 0.2x0.675 smd: 1(-1,-0.437) 2(-0.5,-0.437) 3(0.5,-0.437) 4(1,-0.437) 5(1,0.437) 6(0.5,0.437) 7(-0.5,0.437) 8(-1,0.437)
  rect 0.4x1.55 smd: 3(0,0)
Top Overlay:
  circle w0.25: c-1.075,-1.45 r0.125
  lines w0.2: -1.375,-1.05 1.375,-1.05 1.375,1.075 -1.375,1.075 -1.375,-1.05
Mechanical 11:
  text ".Designator" at -1.425,1.575 h1
Mechanical 14:
  lines w0.2: -1.25,0.475 -1.25,-0.5 1.25,-0.5 1.25,0.5 -1.225,0.5
Mechanical 15:
  lines w0.05: -0.25,0 0.25,0 ; 0,-0.25 0,0.25 ; 0,0 0,0.238 ; 1.275,0.875 -1.3,0.875 -1.3,-0.875 1.3,-0.875 1.3,0.85
3D body "User Library-SLP2510P8.SLDPRT": height 0.56, standoff -0.03, extent -1.25,-0.505 1.25,0.505

## SN74LVC1T45_SC70_6 [mm] "SOT23, 6-Leads, Body 2.15x1.4mm, Pitch 0.65mm, IPC Medium Density"
height 1.1
pads (6):
  rect 0.85x0.4 smd: 1(-1.125,0.65) 2(-1.125,0) 3(-1.125,-0.65) 4(1.125,-0.65) 5(1.125,0) 6(1.125,0.65)
Top Overlay:
  circle w0.25: c-1.125,1.4 r0.125
  lines w0.2: -0.3,-1.1 -0.3,1.1 0.3,1.1 0.3,-1.1 -0.3,-1.1
Mechanical 11:
  text ".Designator" at -1.725,1.75 h1
Mechanical 14:
  lines w0.1: -0.688,0.787 -0.425,1.05 ; -0.7,-1.075 0.7,-1.075 0.7,1.075 -0.7,1.075 -0.7,-1.075
Mechanical 15:
  lines w0.05: -1.8,-1.35 1.8,-1.35 1.8,1.35 -1.8,1.35 -1.8,-1.35
  lines w0.1: -0.5,0 0.5,0 ; 0,-0.5 0,0.5
3D body "DCK0006AakaMAA06.stp": height 1.1, standoff -0.01, extent -1.14,-1 1.14,1